# Altium schematic symbol library AliPadash.SchLib: 1186 symbols (part 1 of 6) (continued)
## ACTELA3P250 (continued)
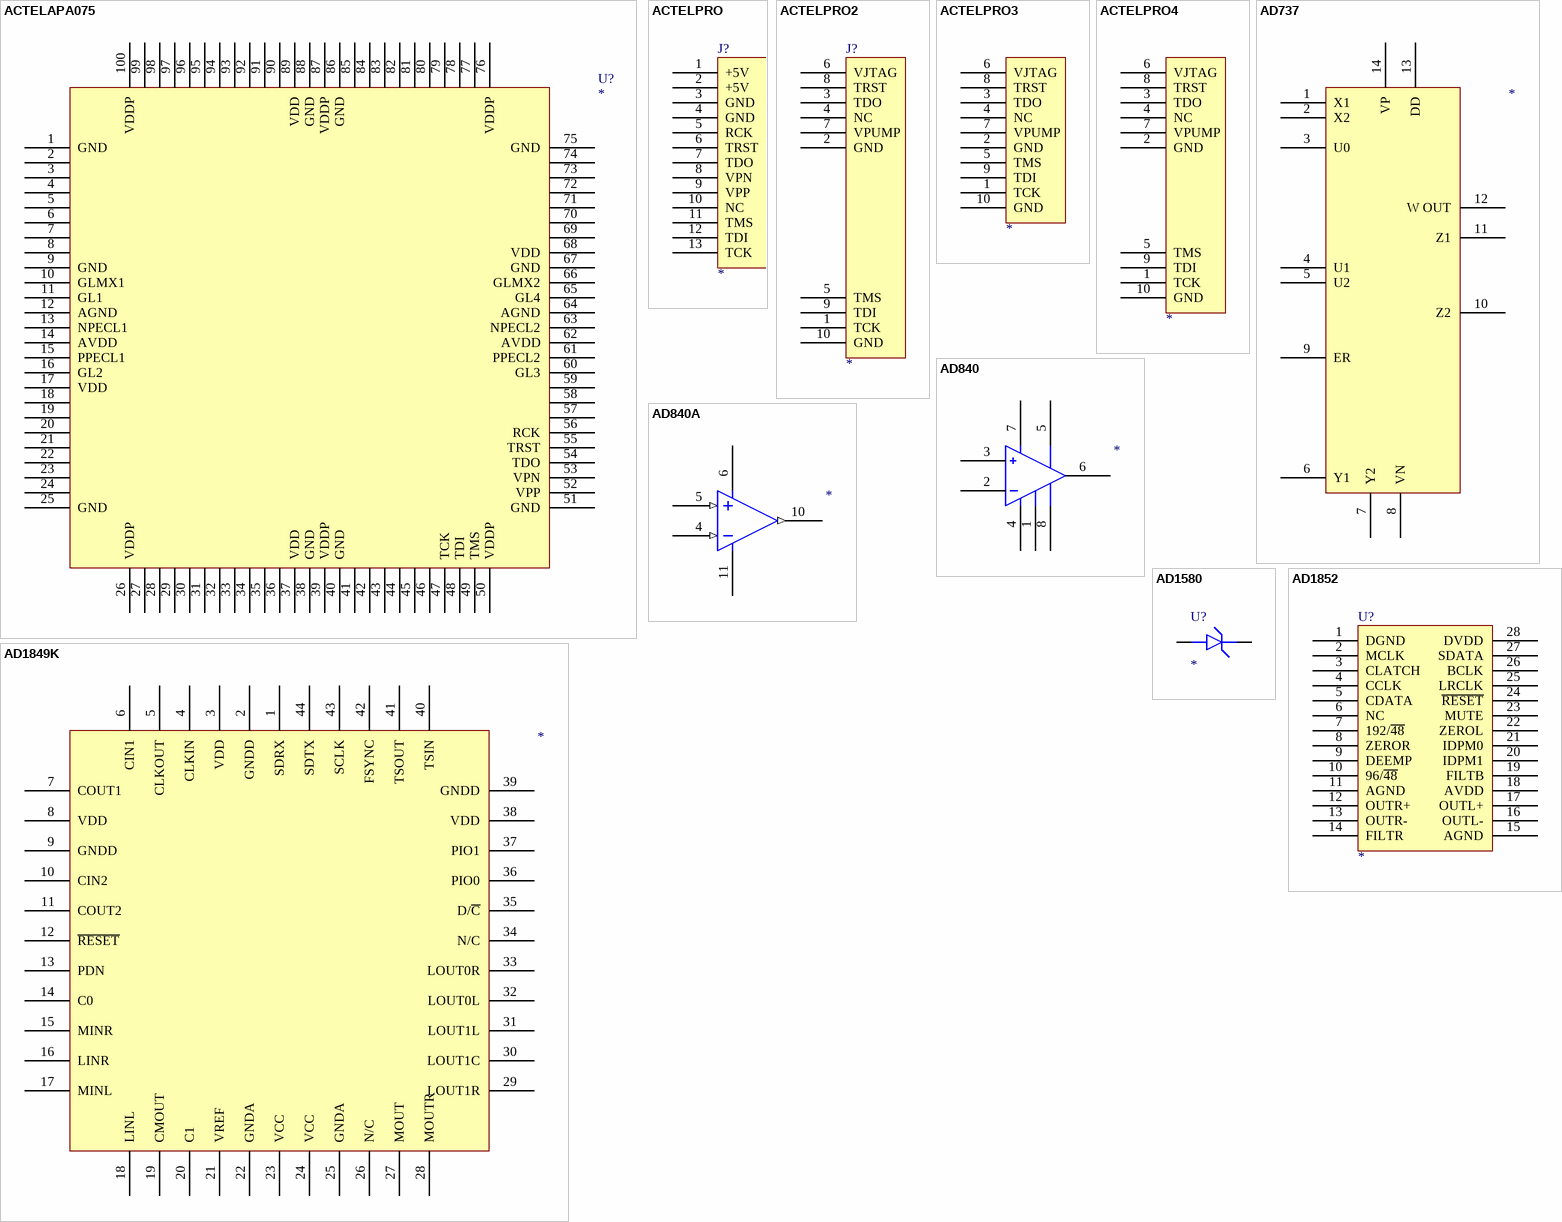
[diagram p10: symbols ACTELAPA075 to AD1852]
text: 0

## ACTELAPA075
designator U?
footprint TQFP-100(FPGA)
pins: 1 GND, 2, 3, 4, 5, 6, 7, 8, 9 GND, 10 GLMX1, 11 GL1, 12 AGND, 13 NPECL1, 14 AVDD, 15 PPECL1, 16 GL2, 17 VDD, 18, 19, 20, 21, 22, 23, 24, 25 GND, 26 VDDP, 27, 28, 29, 30, 31, 32, 33, 34, 35, 36, 37 VDD, 38 GND, 39 VDDP, 40 GND, 41, 42, 43, 44, 45, 46, 47 TCK, 48 TDI, 49 TMS, 50 VDDP, 51 GND, 52 VPP, 53 VPN, 54 TDO, 55 TRST, 56 RCK, 57, 58, 59, 60 GL3, 61 PPECL2, 62 AVDD, 63 NPECL2, 64 AGND, 65 GL4, 66 GLMX2, 67 GND, 68 VDD, 69, 70, 71, 72, 73, 74, 75 GND, 76 VDDP, 77, 78, 79, 80, 81, 82, 83, 84, 85, 86 GND, 87 VDDP, 88 GND, 89 VDD, 90, 91, 92, 93, 94, 95, 96, 97, 98, 99, 100 VDDP

## ACTELPRO
designator J?
footprint ACTEL-PRO
pins: 1 +5V, 2 +5V, 3 GND, 4 GND, 5 RCK, 6 TRST, 7 TDO, 8 VPN, 9 VPP, 10 NC, 11 TMS, 12 TDI, 13 TCK

## ACTELPRO2
designator J?
footprint CON10-F2
pins: 1 TCK, 2 GND, 3 TDO, 4 NC, 5 TMS, 6 VJTAG, 7 VPUMP, 8 TRST, 9 TDI, 10 GND

## ACTELPRO3
designator ?
pins: 1 TCK, 2 GND, 3 TDO, 4 NC, 5 TMS, 6 VJTAG, 7 VPUMP, 8 TRST, 9 TDI, 10 GND

## ACTELPRO4
designator ?
pins: 1 TCK, 2 GND, 3 TDO, 4 NC, 5 TMS, 6 VJTAG, 7 VPUMP, 8 TRST, 9 TDI, 10 GND

## AD737
designator ?
pins: 1 X1, 2 X2, 3 U0, 4 U1, 5 U2, 6 Y1, 7 Y2, 8 VN, 9 ER, 10 Z2, 11 Z1, 12 W OUT, 13 DD, 14 VP

## AD840
designator ?
pins: 1, 2, 3, 4, 5, 6, 7, 8

## AD840A
designator ?
pins: 4 -IN (in), 5 +IN (in), 6 V-, 10 OUT (out), 11 V+

## AD1580
designator U?
footprint SMD-23
pins: 1 A, 2 K

## AD1849K
designator ?
U?
pins: 1 SDRX, 2 GNDD, 3 VDD, 4 CLKIN, 5 CLKOUT, 6 CIN1, 7 COUT1, 8 VDD (power), 9 GNDD (power), 10 CIN2, 11 COUT2, 12 ~{RESET}, 13 PDN, 14 C0, 15 MINR, 16 LINR, 17 MINL, 18 LINL, 19 CMOUT, 20 C1, 21 VREF, 22 GNDA (power), 23 VCC (power), 24 VCC (power), 25 GNDA (power), 26 N/C, 27 MOUT, 28 MOUTR, 29 LOUT1R, 30 LOUT1C, 31 LOUT1L, 32 LOUT0L, 33 LOUT0R, 34 N/C, 35 D/~{C}, 36 PIO0, 37 PIO1, 38 VDD (power), 39 GNDD (power), 40 TSIN, 41 TSOUT, 42 FSYNC, 43 SCLK, 44 SDTX

## AD1852
designator U?
footprint RS-28
pins: 1 DGND, 2 MCLK, 3 CLATCH, 4 CCLK, 5 CDATA, 6 NC, 7 192/~{48}, 8 ZEROR, 9 DEEMP, 10 96/~{48}, 11 AGND, 12 OUTR+, 13 OUTR-, 14 FILTR, 15 AGND, 16 OUTL-, 17 OUTL+, 18 AVDD, 19 FILTB, 20 IDPM1, 21 IDPM0, 22 ZEROL, 23 MUTE, 24 ~{RESET}, 25 LRCLK, 26 BCLK, 27 SDATA, 28 DVDD

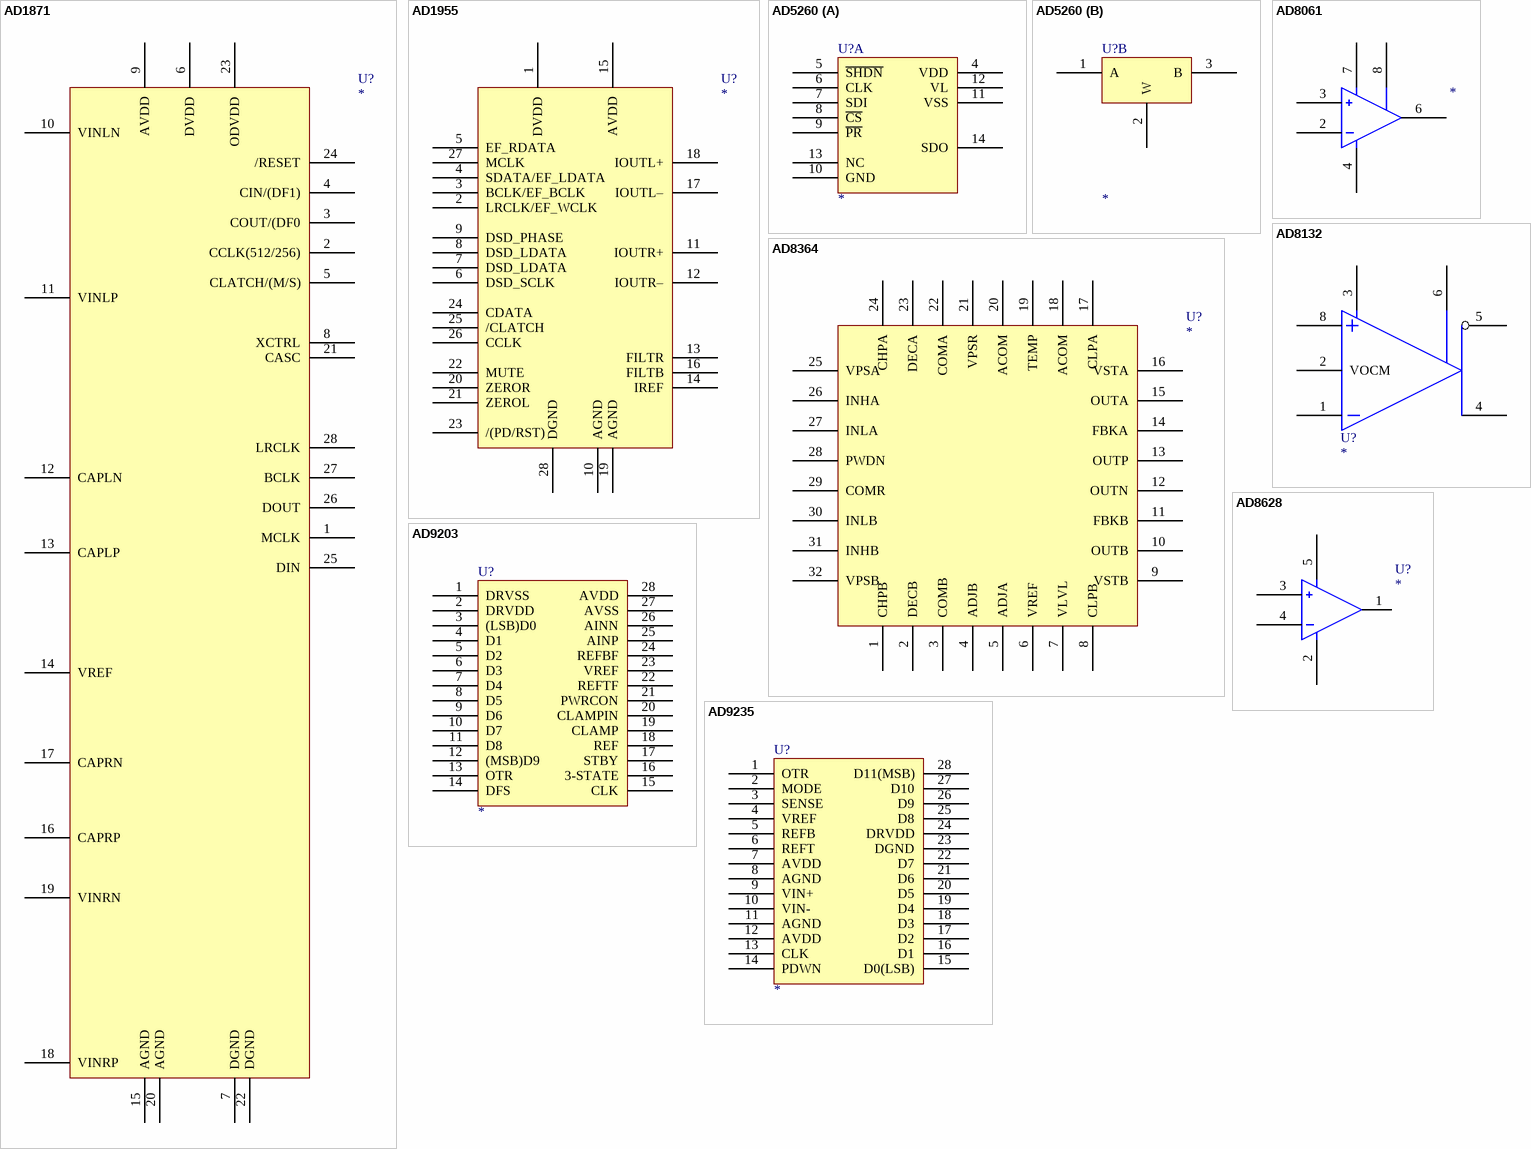
[diagram p11: symbols AD1871 to AD9235]

## AD1871
designator U?
footprint RS-28
pins: 1 MCLK, 2 CCLK(512/256), 3 COUT/(DF0, 4 CIN/(DF1), 5 CLATCH/(M/S), 6 DVDD, 7 DGND, 8 XCTRL, 9 AVDD, 10 VINLN, 11 VINLP, 12 CAPLN, 13 CAPLP, 14 VREF, 15 AGND, 16 CAPRP, 17 CAPRN, 18 VINRP, 19 VINRN, 20 AGND, 21 CASC, 22 DGND, 23 ODVDD, 24 /RESET, 25 DIN, 26 DOUT, 27 BCLK, 28 LRCLK

## AD1955
designator U?
footprint RS-28
pins: 1 DVDD, 2 LRCLK/EF_WCLK, 3 BCLK/EF_BCLK, 4 SDATA/EF_LDATA, 5 EF_RDATA, 6 DSD_SCLK, 7 DSD_LDATA, 8 DSD_LDATA, 9 DSD_PHASE, 10 AGND, 11 IOUTR+, 12 IOUTR–, 13 FILTR, 14 IREF, 15 AVDD, 16 FILTB, 17 IOUTL–, 18 IOUTL+, 19 AGND, 20 ZEROR, 21 ZEROL, 22 MUTE, 23 /(PD/RST), 24 CDATA, 25 /CLATCH, 26 CCLK, 27 MCLK, 28 DGND

## AD5260
designator U?
footprint TSS-14
part A pins: 4 VDD, 5 ~{SHDN}, 6 CLK, 7 SDI, 8 ~{CS}, 9 ~{PR}, 10 GND, 11 VSS, 12 VL, 13 NC, 14 SDO
part B pins: 1 A, 2 W, 3 B

## AD8061
designator ?
pins: 2, 3, 4, 6, 7, 8

## AD8132
designator U?
footprint SO-8
pins: 1, 2 VOCM, 3, 4, 5, 6, 8

## AD8364
designator U?
footprint 32-LFCSP-VQ
pins: 1 CHPB, 2 DECB, 3 COMB, 4 ADJB, 5 ADJA, 6 VREF, 7 VLVL, 8 CLPB, 9 VSTB, 10 OUTB, 11 FBKB, 12 OUTN, 13 OUTP, 14 FBKA, 15 OUTA, 16 VSTA, 17 CLPA, 18 ACOM, 19 TEMP, 20 ACOM, 21 VPSR, 22 COMA, 23 DECA, 24 CHPA, 25 VPSA, 26 INHA, 27 INLA, 28 PWDN, 29 COMR, 30 INLB, 31 INHB, 32 VPSB

## AD8628
designator U?
footprint TSOT05
pins: 1, 2, 3, 4, 5

## AD9203
designator U?
footprint LTSSO-28
pins: 1 DRVSS, 2 DRVDD, 3 (LSB)D0, 4 D1, 5 D2, 6 D3, 7 D4, 8 D5, 9 D6, 10 D7, 11 D8, 12 (MSB)D9, 13 OTR, 14 DFS, 15 CLK, 16 3-STATE, 17 STBY, 18 REF, 19 CLAMP, 20 CLAMPIN, 21 PWRCON, 22 REFTF, 23 VREF, 24 REFBF, 25 AINP, 26 AINN, 27 AVSS, 28 AVDD

## AD9235
designator U?
footprint LTSSO-28
pins: 1 OTR, 2 MODE, 3 SENSE, 4 VREF, 5 REFB, 6 REFT, 7 AVDD, 8 AGND, 9 VIN+, 10 VIN-, 11 AGND, 12 AVDD, 13 CLK, 14 PDWN, 15 D0(LSB), 16 D1, 17 D2, 18 D3, 19 D4, 20 D5, 21 D6, 22 D7, 23 DGND, 24 DRVDD, 25 D8, 26 D9, 27 D10, 28 D11(MSB)

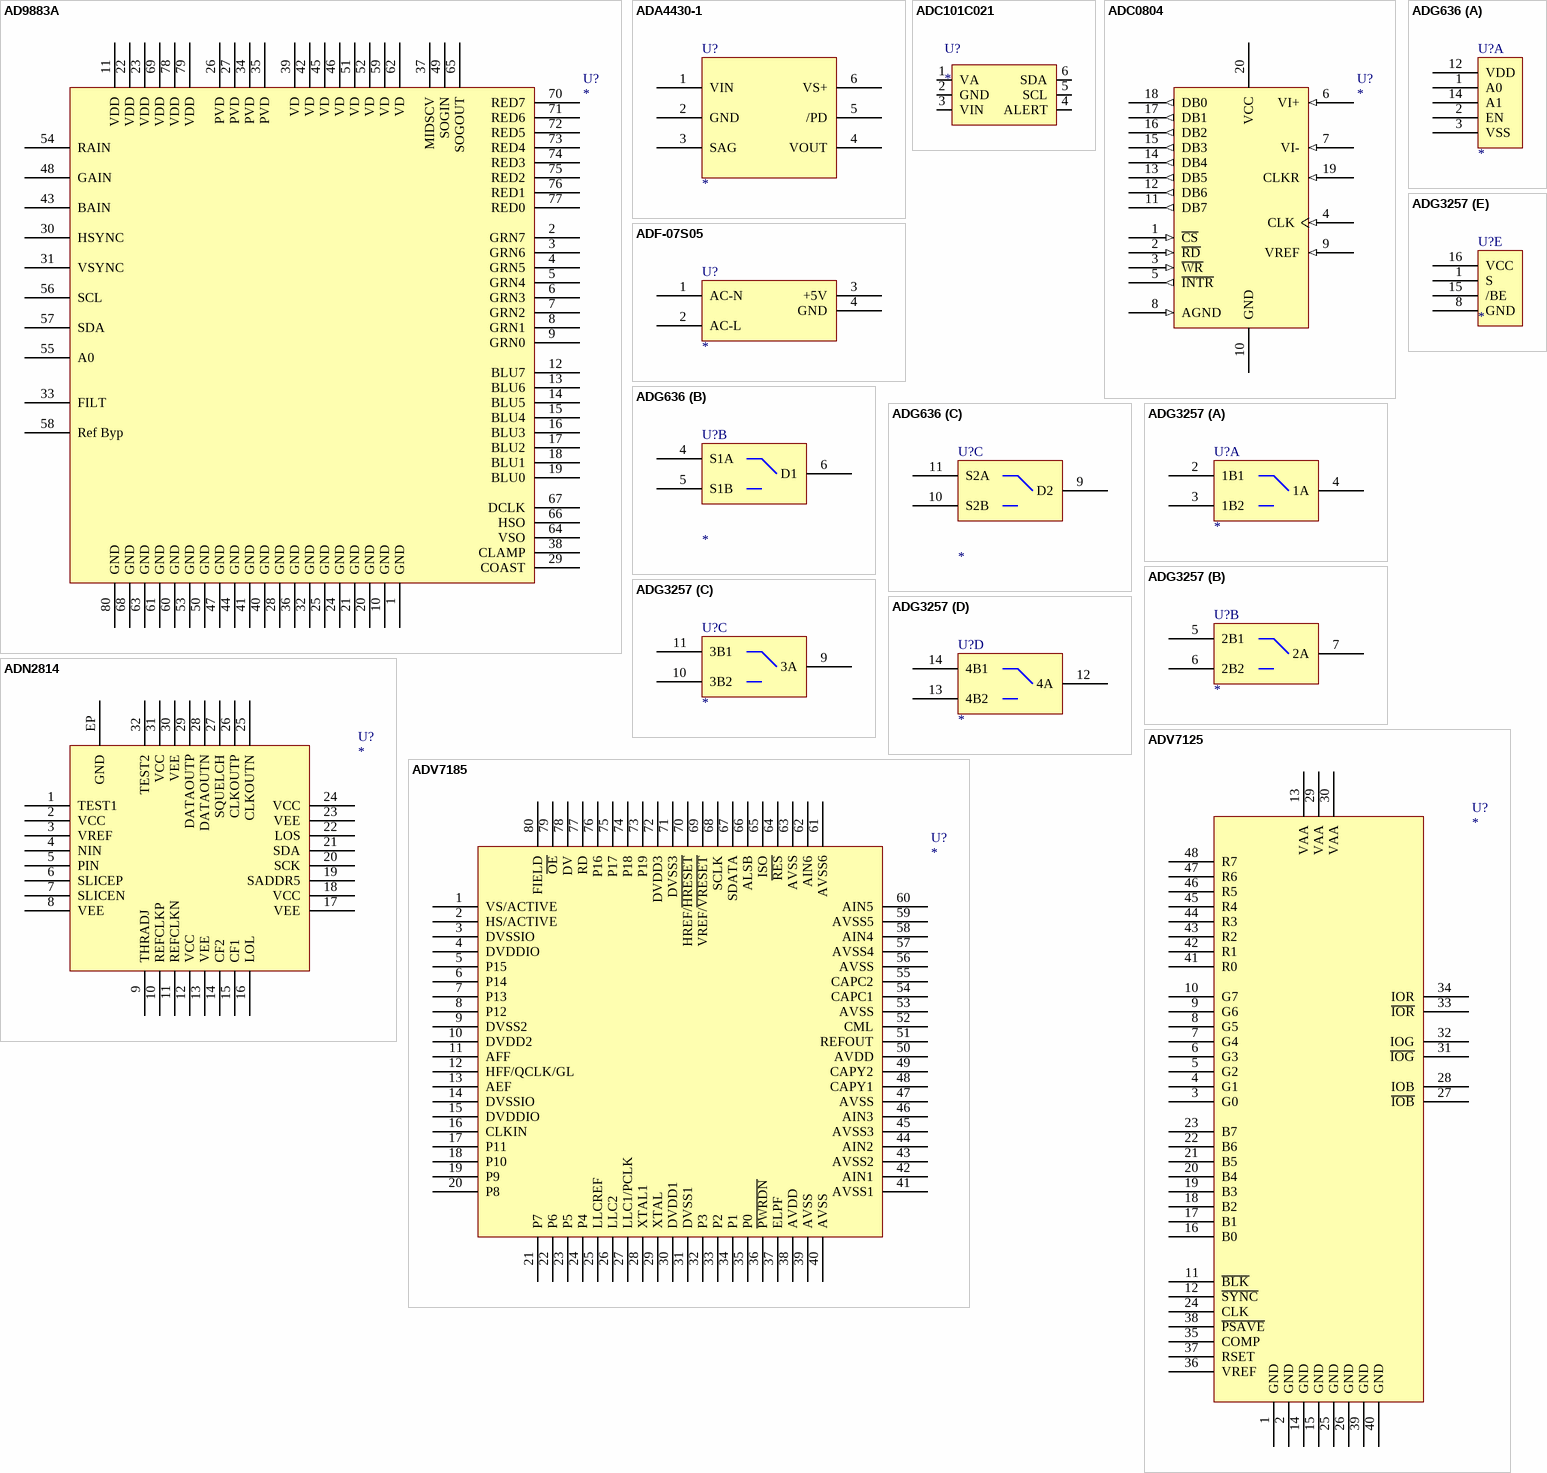
[diagram p12: symbols AD9883A to ADV7185]

## AD9883A
designator U?
footprint LQFP80B
pins: 1 GND, 2 GRN7, 3 GRN6, 4 GRN5, 5 GRN4, 6 GRN3, 7 GRN2, 8 GRN1, 9 GRN0, 10 GND, 11 VDD, 12 BLU7, 13 BLU6, 14 BLU5, 15 BLU4, 16 BLU3, 17 BLU2, 18 BLU1, 19 BLU0, 20 GND, 21 GND, 22 VDD, 23 VDD, 24 GND, 25 GND, 26 PVD, 27 PVD, 28 GND, 29 COAST, 30 HSYNC, 31 VSYNC, 32 GND, 33 FILT, 34 PVD, 35 PVD, 36 GND, 37 MIDSCV, 38 CLAMP, 39 VD, 40 GND, 41 GND, 42 VD, 43 BAIN, 44 GND, 45 VD, 46 VD, 47 GND, 48 GAIN, 49 SOGIN, 50 GND, 51 VD, 52 VD, 53 GND, 54 RAIN, 55 A0, 56 SCL, 57 SDA, 58 Ref Byp, 59 VD, 60 GND, 61 GND, 62 VD, 63 GND, 64 VSO, 65 SOGOUT, 66 HSO, 67 DCLK, 68 GND, 69 VDD, 70 RED7, 71 RED6, 72 RED5, 73 RED4, 74 RED3, 75 RED2, 76 RED1, 77 RED0, 78 VDD, 79 VDD, 80 GND

## ADA4430-1
designator U?
footprint SOT363
pins: 1 VIN, 2 GND, 3 SAG, 4 VOUT, 5 /PD, 6 VS+

## ADC101C021
designator U?
footprint SOT-25B
pins: 1 VA, 2 GND, 3 VIN, 4 ALERT, 5 SCL, 6 SDA

## ADC0804
designator U?
pins: 1 ~{CS} (in), 2 ~{RD} (in), 3 ~{WR} (in), 4 CLK (in), 5 ~{INTR} (out), 6 VI+ (in), 7 VI- (in), 8 AGND (in), 9 VREF (in), 10 GND (power), 11 DB7 (out), 12 DB6 (out), 13 DB5 (out), 14 DB4 (out), 15 DB3 (out), 16 DB2 (out), 17 DB1 (out), 18 DB0 (out), 19 CLKR (in), 20 VCC (power)

## ADF-07S05
designator U?
footprint PWR-MODL1
pins: 1 AC-N, 2 AC-L, 3 +5V, 4 GND

## ADG636
designator U?
footprint RU-14
part A pins: 1 A0, 2 EN, 3 VSS, 12 VDD, 14 A1
part B pins: 4 S1A, 5 S1B, 6 D1
part C pins: 9 D2, 10 S2B, 11 S2A

## ADG3257
designator U?
footprint RQ-16
part A pins: 2 1B1, 3 1B2, 4 1A
part B pins: 5 2B1, 6 2B2, 7 2A
part C pins: 9 3A, 10 3B2, 11 3B1
part D pins: 12 4A, 13 4B2, 14 4B1
part E pins: 1 S, 8 GND, 15 /BE, 16 VCC

## ADN2814
designator U?
footprint 32-LFCSP-VQ
pins: 1 TEST1, 2 VCC, 3 VREF, 4 NIN, 5 PIN, 6 SLICEP, 7 SLICEN, 8 VEE, 9 THRADJ, 10 REFCLKP, 11 REFCLKN, 12 VCC, 13 VEE, 14 CF2, 15 CF1, 16 LOL, 17 VEE, 18 VCC, 19 SADDR5, 20 SCK, 21 SDA, 22 LOS, 23 VEE, 24 VCC, 25 CLKOUTN, 26 CLKOUTP, 27 SQUELCH, 28 DATAOUTN, 29 DATAOUTP, 30 VEE, 31 VCC, 32 TEST2, EP GND

## ADV7125
designator U?
footprint ST-48
pins: 1 GND, 2 GND, 3 G0, 4 G1, 5 G2, 6 G3, 7 G4, 8 G5, 9 G6, 10 G7, 11 ~{BLK}, 12 ~{SYNC}, 13 VAA, 14 GND, 15 GND, 16 B0, 17 B1, 18 B2, 19 B3, 20 B4, 21 B5, 22 B6, 23 B7, 24 CLK, 25 GND, 26 GND, 27 ~{IOB}, 28 IOB, 29 VAA, 30 VAA, 31 ~{IOG}, 32 IOG, 33 ~{IOR}, 34 IOR, 35 COMP, 36 VREF, 37 RSET, 38 ~{PSAVE}, 39 GND, 40 GND, 41 R0, 42 R1, 43 R2, 44 R3, 45 R4, 46 R5, 47 R6, 48 R7

## ADV7185
designator U?
footprint ST-80
pins: 1 VS/ACTIVE, 2 HS/ACTIVE, 3 DVSSIO, 4 DVDDIO, 5 P15, 6 P14, 7 P13, 8 P12, 9 DVSS2, 10 DVDD2, 11 AFF, 12 HFF/QCLK/GL, 13 AEF, 14 DVSSIO, 15 DVDDIO, 16 CLKIN, 17 P11, 18 P10, 19 P9, 20 P8, 21 P7, 22 P6, 23 P5, 24 P4, 25 LLCREF, 26 LLC2, 27 LLC1/PCLK, 28 XTAL1, 29 XTAL, 30 DVDD1, 31 DVSS1, 32 P3, 33 P2, 34 P1, 35 P0, 36 ~{PWRDN}, 37 ELPF, 38 AVDD, 39 AVSS, 40 AVSS, 41 AVSS1, 42 AIN1, 43 AVSS2, 44 AIN2, 45 AVSS3, 46 AIN3, 47 AVSS, 48 CAPY1, 49 CAPY2, 50 AVDD, 51 REFOUT, 52 CML, 53 AVSS, 54 CAPC1, 55 CAPC2, 56 AVSS, 57 AVSS4, 58 AIN4, 59 AVSS5, 60 AIN5, 61 AVSS6, 62 AIN6, 63 AVSS, 64 ~{RES}, 65 ISO, 66 ALSB, 67 SDATA, 68 SCLK, 69 VREF/~{VRESET}, 70 HREF/~{HRESET}, 71 DVSS3, 72 DVDD3, 73 P19, 74 P18, 75 P17, 76 P16, 77 RD, 78 DV, 79 ~{OE}, 80 FIELD

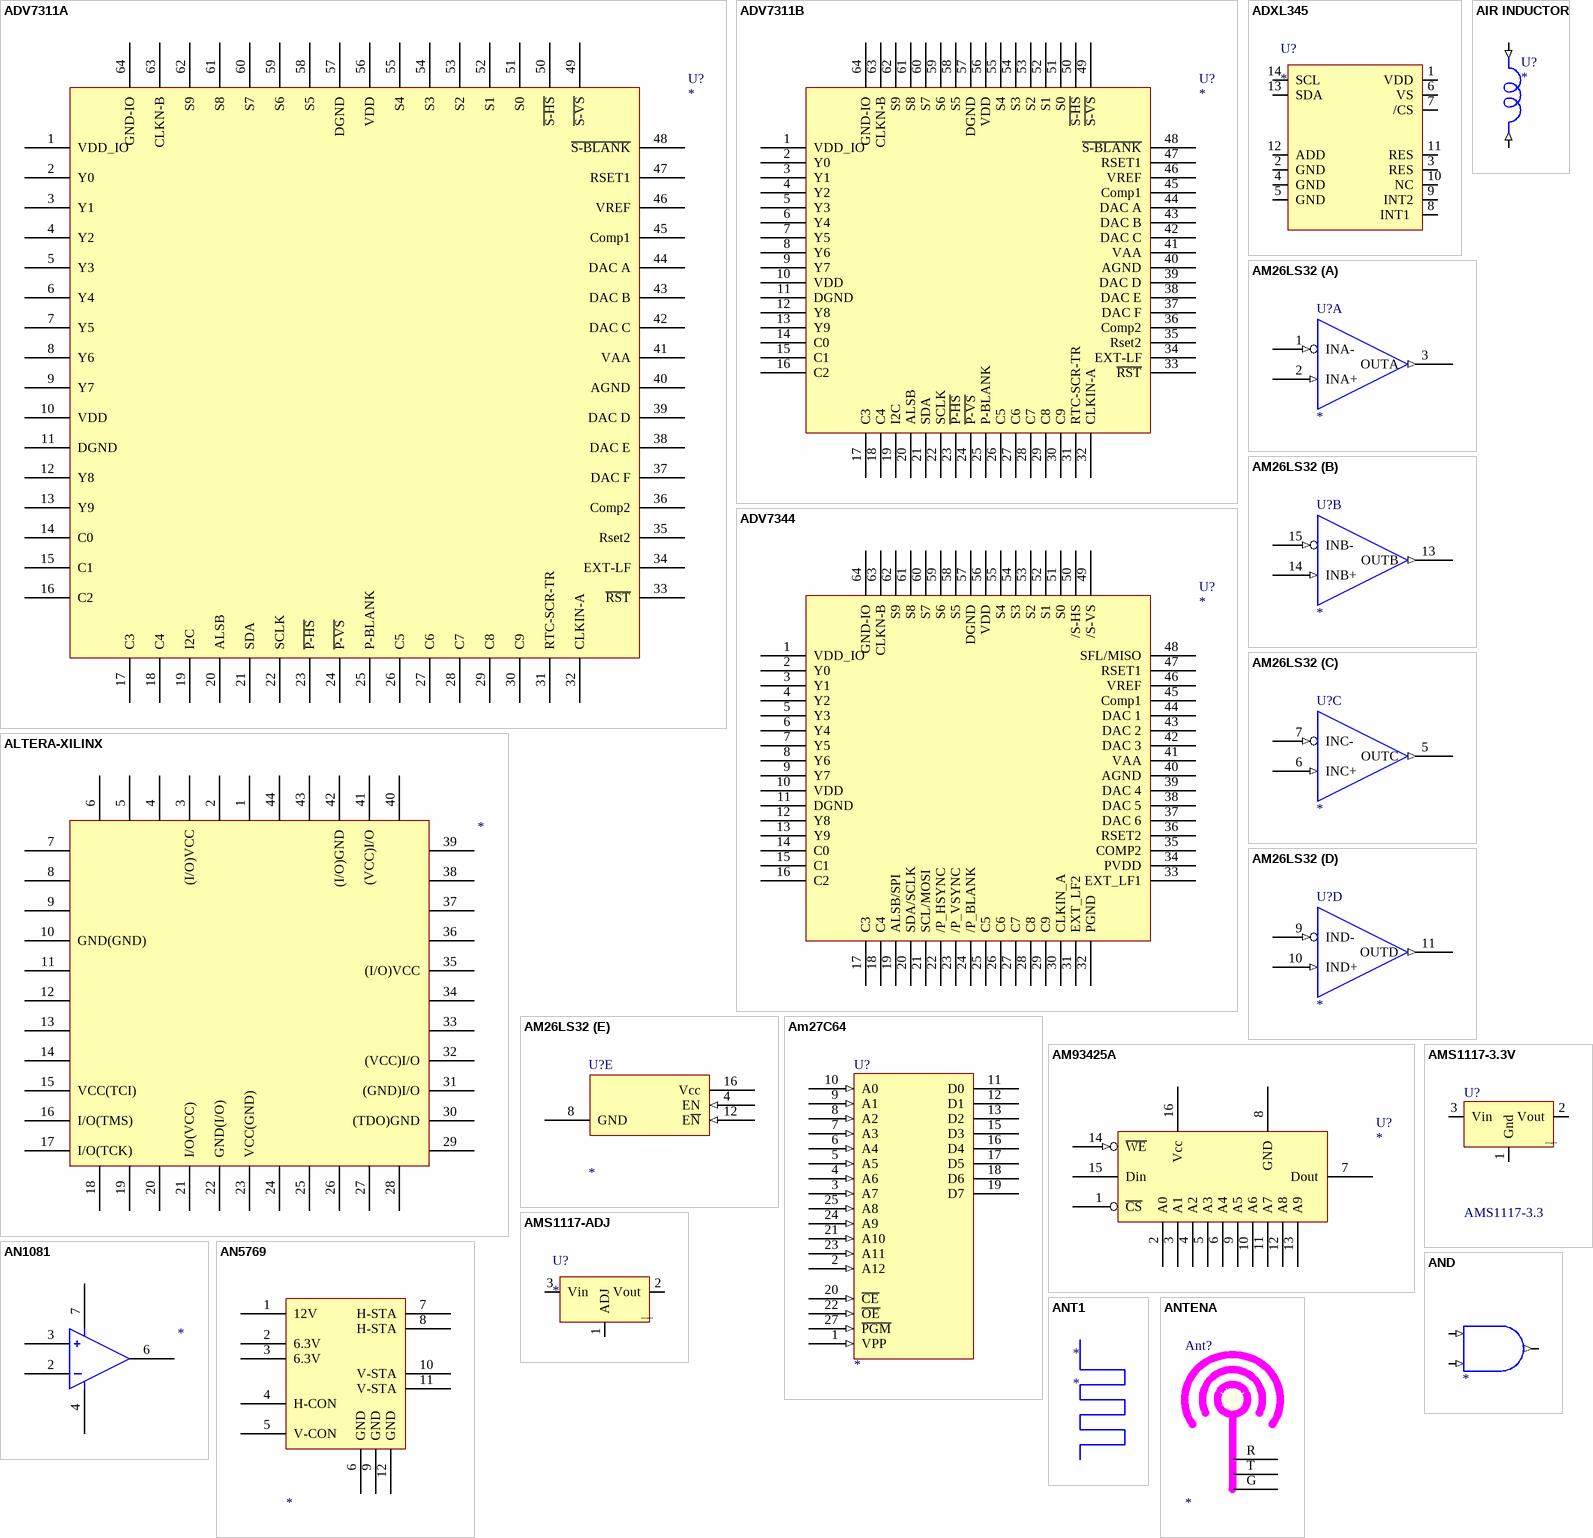
[diagram p13: symbols ADV7311A to ANTENA]

## ADV7311A
designator U?
U?
footprint ST-64B
pins: 1 VDD_IO, 2 Y0, 3 Y1, 4 Y2, 5 Y3, 6 Y4, 7 Y5, 8 Y6, 9 Y7, 10 VDD, 11 DGND, 12 Y8, 13 Y9, 14 C0, 15 C1, 16 C2, 17 C3, 18 C4, 19 I2C, 20 ALSB, 21 SDA, 22 SCLK, 23 ~{P-HS}, 24 ~{P-VS}, 25 P-BLANK, 26 C5, 27 C6, 28 C7, 29 C8, 30 C9, 31 RTC-SCR-TR, 32 CLKIN-A, 33 ~{RST}, 34 EXT-LF, 35 Rset2, 36 Comp2, 37 DAC F, 38 DAC E, 39 DAC D, 40 AGND, 41 VAA, 42 DAC C, 43 DAC B, 44 DAC A, 45 Comp1, 46 VREF, 47 RSET1, 48 ~{S-BLANK}, 49 ~{S-VS}, 50 ~{S-HS}, 51 S0, 52 S1, 53 S2, 54 S3, 55 S4, 56 VDD, 57 DGND, 58 S5, 59 S6, 60 S7, 61 S8, 62 S9, 63 CLKN-B, 64 GND-IO

## ADV7311B
designator U?
footprint ST-64B
pins: 1 VDD_IO, 2 Y0, 3 Y1, 4 Y2, 5 Y3, 6 Y4, 7 Y5, 8 Y6, 9 Y7, 10 VDD, 11 DGND, 12 Y8, 13 Y9, 14 C0, 15 C1, 16 C2, 17 C3, 18 C4, 19 I2C, 20 ALSB, 21 SDA, 22 SCLK, 23 ~{P-HS}, 24 ~{P-VS}, 25 P-BLANK, 26 C5, 27 C6, 28 C7, 29 C8, 30 C9, 31 RTC-SCR-TR, 32 CLKIN-A, 33 ~{RST}, 34 EXT-LF, 35 Rset2, 36 Comp2, 37 DAC F, 38 DAC E, 39 DAC D, 40 AGND, 41 VAA, 42 DAC C, 43 DAC B, 44 DAC A, 45 Comp1, 46 VREF, 47 RSET1, 48 ~{S-BLANK}, 49 ~{S-VS}, 50 ~{S-HS}, 51 S0, 52 S1, 53 S2, 54 S3, 55 S4, 56 VDD, 57 DGND, 58 S5, 59 S6, 60 S7, 61 S8, 62 S9, 63 CLKN-B, 64 GND-IO

## ADV7344
designator U?
footprint ST-64B
pins: 1 VDD_IO, 2 Y0, 3 Y1, 4 Y2, 5 Y3, 6 Y4, 7 Y5, 8 Y6, 9 Y7, 10 VDD, 11 DGND, 12 Y8, 13 Y9, 14 C0, 15 C1, 16 C2, 17 C3, 18 C4, 19 ALSB/SPI, 20 SDA/SCLK, 21 SCL/MOSI, 22 /P_HSYNC, 23 /P_VSYNC, 24 /P_BLANK, 25 C5, 26 C6, 27 C7, 28 C8, 29 C9, 30 CLKIN_A, 31 EXT_LF2, 32 PGND, 33 EXT_LF1, 34 PVDD, 35 COMP2, 36 RSET2, 37 DAC 6, 38 DAC 5, 39 DAC 4, 40 AGND, 41 VAA, 42 DAC 3, 43 DAC 2, 44 DAC 1, 45 Comp1, 46 VREF, 47 RSET1, 48 SFL/MISO, 49 /S-VS, 50 /S-HS, 51 S0, 52 S1, 53 S2, 54 S3, 55 S4, 56 VDD, 57 DGND, 58 S5, 59 S6, 60 S7, 61 S8, 62 S9, 63 CLKN-B, 64 GND-IO

## ADXL345
designator U?
footprint LGA14 (Footprint not found)
pins: 1 VDD, 2 GND, 3 RES, 4 GND, 5 GND, 6 VS, 7 /CS, 8 INT1 , 9 INT2, 10 NC, 11 RES, 12 ADD, 13 SDA, 14 SCL

## AIR INDUCTOR
designator U?
pins: 1 (in), 2 (in)

## ALTERA-XILINX
designator ?
pins: 1, 2, 3 (I/O)VCC, 4, 5, 6, 7, 8, 9, 10 GND(GND), 11, 12, 13, 14, 15 VCC(TCI), 16 I/O(TMS), 17 I/O(TCK), 18, 19, 20, 21 I/O(VCC), 22 GND(I/O), 23 VCC(GND), 24, 25, 26, 27, 28, 29, 30 (TDO)GND, 31 (GND)I/O, 32 (VCC)I/O, 33, 34, 35 (I/O)VCC, 36, 37, 38, 39, 40, 41 (VCC)I/O, 42 (I/O)GND, 43, 44

## AM26LS32
designator U?
footprint SO-16
part A pins: 1 INA- (in), 2 INA+ (in), 3 OUTA (out)
part B pins: 13 OUTB (out), 14 INB+ (in), 15 INB- (in)
part C pins: 5 OUTC (out), 6 INC+ (in), 7 INC- (in)
part D pins: 9 IND- (in), 10 IND+ (in), 11 OUTD (out)
part E pins: 4 EN (in), 8 GND (power), 12 E~{N} (in), 16 Vcc (power)

## Am27C64
designator U?
footprint DIP28
pins: 1 VPP (in), 2 A12 (in), 3 A7 (in), 4 A6 (in), 5 A5 (in), 6 A4 (in), 7 A3 (in), 8 A2 (in), 9 A1 (in), 10 A0 (in), 11 D0 (hiz), 12 D1 (hiz), 13 D2 (hiz), 14 GND (power) hidden to GND, 15 D3 (hiz), 16 D4 (hiz), 17 D5 (hiz), 18 D6 (hiz), 19 D7 (hiz), 20 ~{CE} (in), 21 A10 (in), 22 ~{OE} (in), 23 A11 (in), 24 A9 (in), 25 A8 (in), 27 ~{PGM} (in), 28 VCC (power) hidden to VCC

## AM93425A
designator U?
footprint DIP16
pins: 1 ~{CS}, 2 A0, 3 A1, 4 A2, 5 A3, 6 A4, 7 Dout, 8 GND, 9 A5, 10 A6, 11 A7, 12 A8, 13 A9, 14 ~{WE} (in), 15 Din, 16 Vcc

## AMS1117-3.3V
designator U?, comment AMS1117-3.3
JLC: C6186; MFAC: AMS1117-3.3
footprint SOT-223-3
pins: 1 Gnd, 2 Vout, 3 Vin
text: @DesignPCB

## AMS1117-ADJ
designator U?
JLC: *; MFAC: *
footprint SOT-232
pins: 1 ADJ, 2 Vout, 3 Vin
text: @DesignPCB

## AN1081
designator ?
pins: 2, 3, 4, 6, 7

## AN5769
designator ?
pins: 1 12V, 2 6.3V, 3 6.3V, 4 H-CON, 5 V-CON, 6 GND, 7 H-STA, 8 H-STA, 9 GND, 10 V-STA, 11 V-STA, 12 GND

## AND
designator ?
pins: 1 (in), 2 (in), 3 (out)

## ANT1
designator *

## ANTENA
designator Ant?
footprint ANTENAVR1
pins: G, R, T

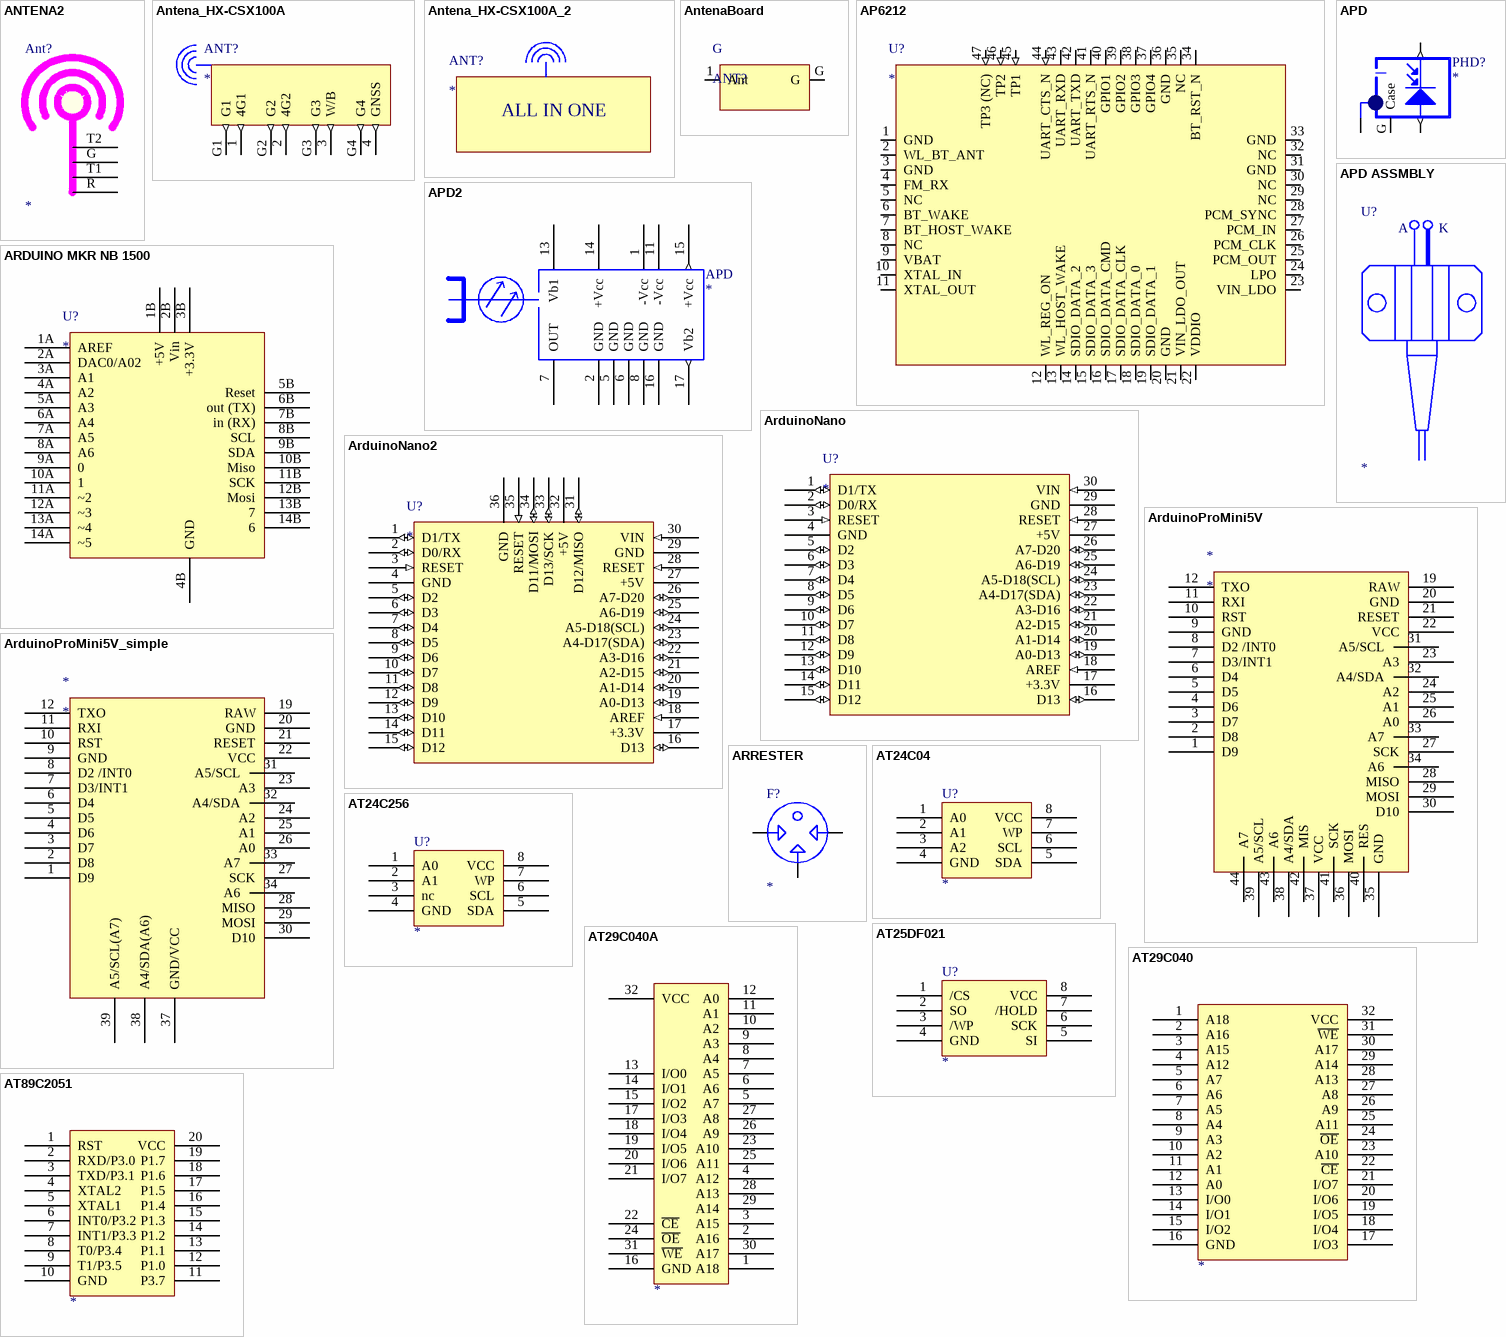
[diagram p14: symbols ANTENA2 to AT89C2051]

## ANTENA2
designator Ant?
footprint ANTENAVR1
pins: G, R, T1, T2

## Antena_HX-CSX100A
designator ANT?
footprint Antena_HX-CSX100A
pins: 1 4G1 (out), 2 4G2 (out), 3 W/B (out), 4 GNSS (out), G1 (out), G2 (out), G3 (out), G4 (out)

## Antena_HX-CSX100A_2
designator ANT?
footprint Antena_HX-CSX100A
text: ALL IN ONE

## AntenaBoard
designator G, comment ANT?
footprint BLU-ANT (Footprint not found)
pins: 1 Ant, G

## AP6212
designator U?
footprint Module-AP6212
pins: 1 GND (power), 2 WL_BT_ANT (power), 3 GND (power), 4 FM_RX (power), 5 NC (power), 6 BT_WAKE (power), 7 BT_HOST_WAKE (power), 8 NC (power), 9 VBAT (power), 10 XTAL_IN (power), 11 XTAL_OUT (power), 12 WL_REG_ON (power), 13 WL_HOST_WAKE (power), 14 SDIO_DATA_2 (power), 15 SDIO_DATA_3 (power), 16 SDIO_DATA_CMD (power), 17 SDIO_DATA_CLK (power), 18 SDIO_DATA_0 (power), 19 SDIO_DATA_1 (power), 20 GND (power), 21 VIN_LDO_OUT (power), 22 VDDIO (power), 23 VIN_LDO (power), 24 LPO (power), 25 PCM_OUT (power), 26 PCM_CLK (power), 27 PCM_IN (power), 28 PCM_SYNC (power), 29 NC (power), 30 NC (power), 31 GND (power), 32 NC (power), 33 GND (power), 34 BT_RST_N (power), 35 NC (power), 36 GND (power), 37 GPIO4 (power), 38 GPIO3 (power), 39 GPIO2 (power), 40 GPIO1 (power), 41 UART_RTS_N (power), 42 UART_TXD (power), 43 UART_RXD (power), 44 UART_CTS_N (in), 45 TP1 (in), 46 TP2 (in), 47 TP3 (NC) (in)

## APD
designator PHD?
pins: A (out), G Case, G1 G, K (out)

## APD2
designator APD
pins: 1 -Vcc, 2 GND, 5 GND, 6 GND, 7 OUT, 8 GND, 11 -Vcc, 13 Vb1, 14 +Vcc, 15 +Vcc (out), 16 GND, 17 Vb2 (out)

## APD ASSMBLY
designator U?
text: A; K

## ARDUINO MKR NB 1500
designator U?
footprint ARDUINO-MKR-NB-1500
pins: 1A AREF, 1B +5V, 2A DAC0/A02, 2B Vin, 3A A1, 3B +3.3V, 4A A2, 4B GND, 5A A3, 5B Reset, 6A A4, 6B out (TX), 7A A5, 7B in (RX), 8A A6, 8B SCL, 9A 0, 9B SDA, 10A 1, 10B Miso, 11A ~2, 11B SCK, 12A ~3, 12B Mosi, 13A ~4, 13B 7, 14A ~5, 14B 6

## ArduinoNano
designator U?
footprint ARDUINONANO
footprint ArduinoNano
footprint ArduinoNano
pins: 1 D1/TX (io), 2 D0/RX (io), 3 RESET (in), 4 GND (power), 5 D2 (io), 6 D3 (io), 7 D4 (io), 8 D5 (io), 9 D6 (io), 10 D7 (io), 11 D8 (io), 12 D9 (io), 13 D10 (io), 14 D11 (io), 15 D12 (io), 16 D13 (io), 17 +3.3V (power), 18 AREF (in), 19 A0-D13 (io), 20 A1-D14 (io), 21 A2-D15 (io), 22 A3-D16 (io), 23 A4-D17(SDA) (io), 24 A5-D18(SCL) (io), 25 A6-D19 (io), 26 A7-D20 (io), 27 +5V (power), 28 RESET (in), 29 GND (power), 30 VIN (in)

## ArduinoNano2
designator U?
footprint ARDUINONANO
footprint ArduinoNano2
pins: 1 D1/TX (io), 2 D0/RX (io), 3 RESET (in), 4 GND (power), 5 D2 (io), 6 D3 (io), 7 D4 (io), 8 D5 (io), 9 D6 (io), 10 D7 (io), 11 D8 (io), 12 D9 (io), 13 D10 (io), 14 D11 (io), 15 D12 (io), 16 D13 (io), 17 +3.3V (power), 18 AREF (in), 19 A0-D13 (io), 20 A1-D14 (io), 21 A2-D15 (io), 22 A3-D16 (io), 23 A4-D17(SDA) (io), 24 A5-D18(SCL) (io), 25 A6-D19 (io), 26 A7-D20 (io), 27 +5V (power), 28 RESET (in), 29 GND (power), 30 VIN (in), 31 D12/MISO (io), 32 +5V, 33 D13/SCK (io), 34 D11/MOSI (io), 35 RESET (in), 36 GND (power)

## ArduinoProMini5V
designator *
footprint ArduinoProMini5V
pins: 1 D9, 2 D8, 3 D7, 4 D6, 5 D5, 6 D4, 7 D3/INT1, 8 D2 /INT0, 9 GND, 10 RST, 11 RXI, 12 TXO, 19 RAW, 20 GND, 21 RESET, 22 VCC, 23 A3, 24 A2, 25 A1, 26 A0, 27 SCK, 28 MISO, 29 MOSI, 30 D10, 31 A5/SCL, 32 A4/SDA, 33 A7, 34 A6, 35 GND, 36 MOSI, 37 VCC, 38 A4/SDA, 39 A5/SCL, 40 RES, 41 SCK, 42 MIS, 43 A6, 44 A7

## ArduinoProMini5V_simple
designator *
footprint ArduinoProMini5V
pins: 1 D9, 2 D8, 3 D7, 4 D6, 5 D5, 6 D4, 7 D3/INT1, 8 D2 /INT0, 9 GND, 10 RST, 11 RXI, 12 TXO, 19 RAW, 20 GND, 21 RESET, 22 VCC, 23 A3, 24 A2, 25 A1, 26 A0, 27 SCK, 28 MISO, 29 MOSI, 30 D10, 31 A5/SCL, 32 A4/SDA, 33 A7, 34 A6, 37 GND/VCC, 38 A4/SDA(A6), 39 A5/SCL(A7)

## ARRESTER
designator F?
pins: A, B, GND

## AT24C04
designator U?
footprint SO-8
pins: 1 A0, 2 A1, 3 A2, 4 GND, 5 SDA, 6 SCL, 7 WP, 8 VCC

## AT24C256
designator U?
footprint DIP8
pins: 1 A0, 2 A1, 3 nc, 4 GND, 5 SDA, 6 SCL, 7 WP, 8 VCC

## AT25DF021
designator U?
footprint SO-8
pins: 1 /CS, 2 SO, 3 /WP, 4 GND, 5 SI, 6 SCK, 7 /HOLD, 8 VCC

## AT29C040
designator ?
pins: 1 A18, 2 A16, 3 A15, 4 A12, 5 A7, 6 A6, 7 A5, 8 A4, 9 A3, 10 A2, 11 A1, 12 A0, 13 I/O0, 14 I/O1, 15 I/O2, 16 GND, 17 I/O3, 18 I/O4, 19 I/O5, 20 I/O6, 21 I/O7, 22 ~{CE}, 23 A10, 24 ~{OE}, 25 A11, 26 A9, 27 A8, 28 A13, 29 A14, 30 A17, 31 ~{WE}, 32 VCC